# Altium footprint library Integrated Circuits.PcbLib: 142 footprints (part 4 of 9)
Each footprint in its own frame and in the unit in brackets; x right, y up, seen from the top. Pads: shape width x height; smd on the part's side, far side on the other; paste and mask are expansions set on the pad; w line width, h text height; cw(c..) or ccw(c..) is an arc to the next point about the centre after c.
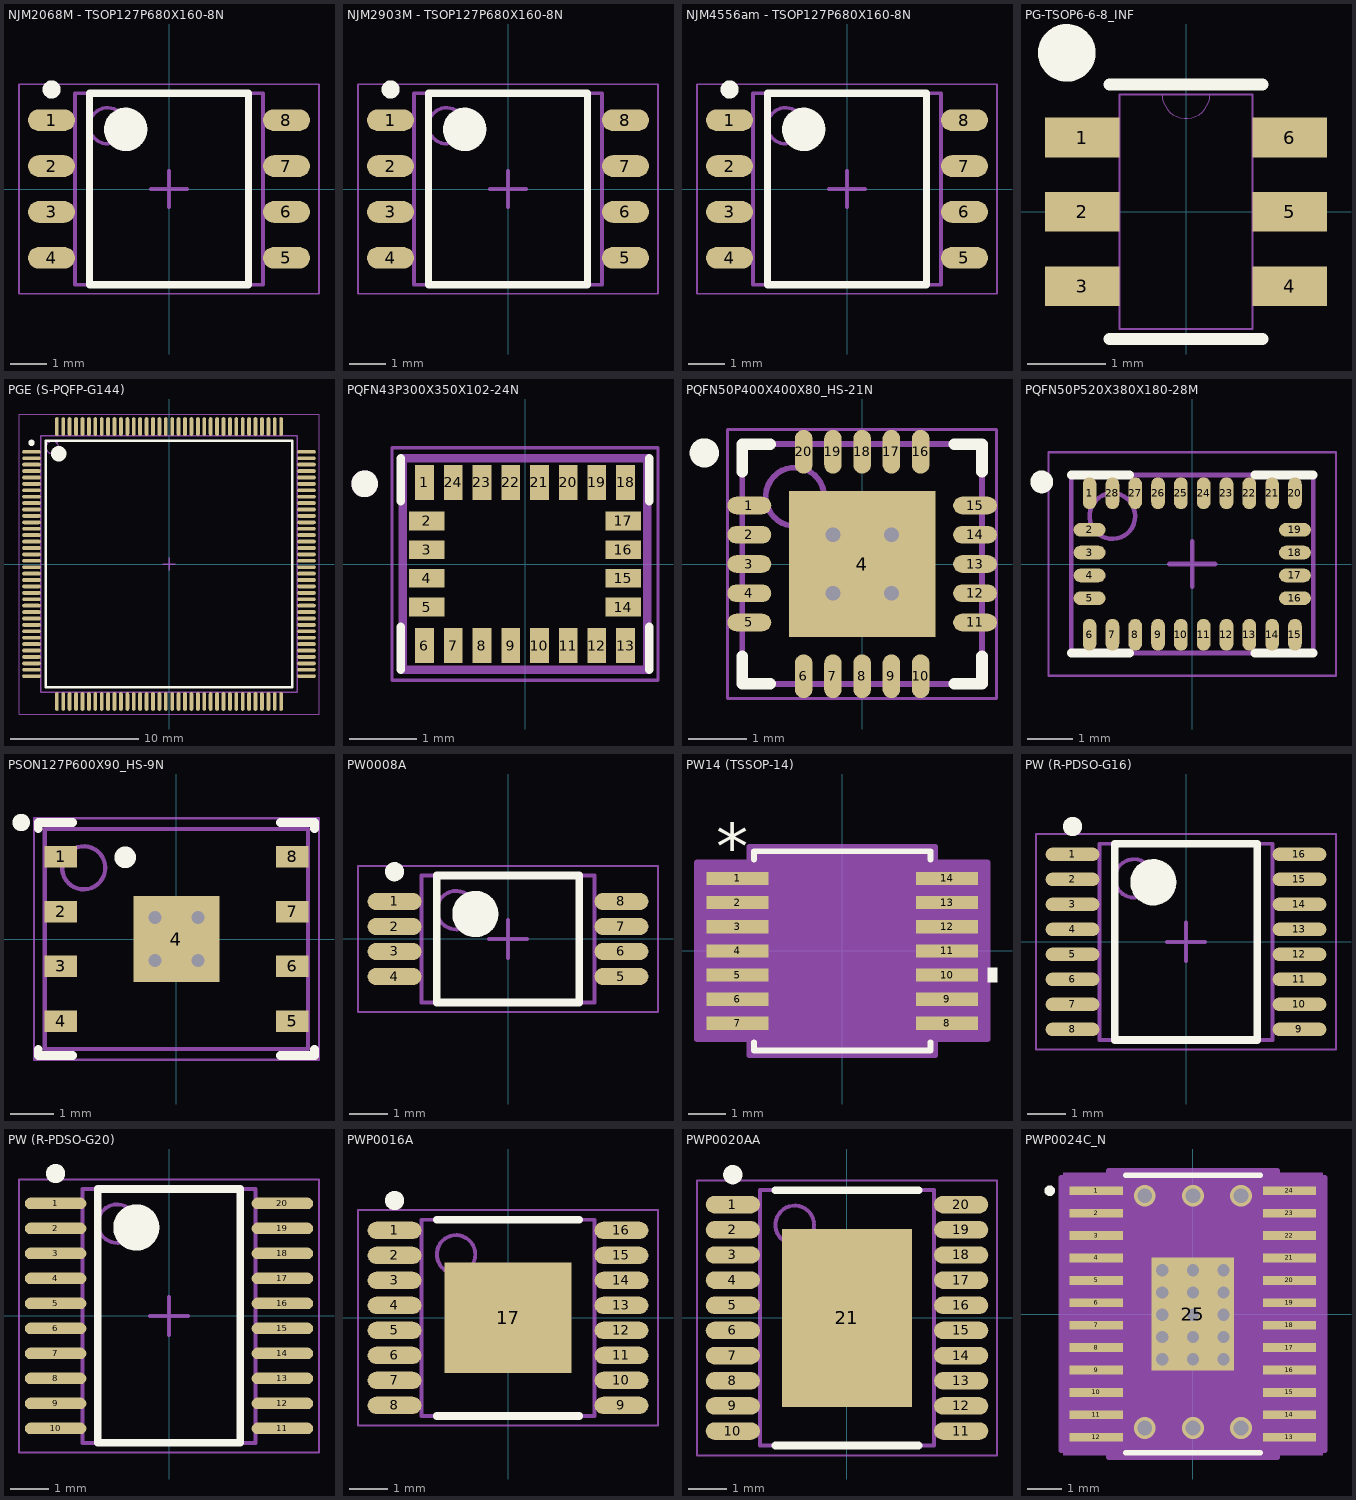
[diagram p3: the footprints below, top view; thin cyan lines are the x and y axes]

## NJM2068M - TSOP127P680X160-8N [mm] "TSOP, 8-Leads, Body 5.00x5.00mm, Pitch 1.27mm, IPC Medium Density"
height 1.6
pads (8):
  oval 1.3x0.6 smd: 1(-3.25,1.905) 2(-3.25,0.635) 3(-3.25,-0.635) 4(-3.25,-1.905) 5(3.25,-1.905) 6(3.25,-0.635) 7(3.25,0.635) 8(3.25,1.905)
Top Overlay:
  circle w0.6: c-1.2,1.65 r0.3
  circle w0.25: c-3.25,2.755 r0.125
  lines w0.2: -2.2,-2.65 2.2,-2.65 2.2,2.65 -2.2,2.65 -2.2,-2.65
Top Courtyard:
  lines w0.05: -4.15,-2.9 4.15,-2.9 4.15,2.9 -4.15,2.9 -4.15,-2.9
  lines w0.1: -0.5,0 0.5,0 ; 0,-0.5 0,0.5
Top Assembly:
  circle w0.1: c-1.7,1.75 r0.5
  lines w0.1: -2.6,-2.65 2.6,-2.65 2.6,2.65 -2.6,2.65 -2.6,-2.65
3D body "DMP8 - NJM2068M v4.step": height 1.75, standoff 0, extent -3.399,-2.502 3.399,2.502

## NJM2903M - TSOP127P680X160-8N [mm] "TSOP, 8-Leads, Body 5.00x5.00mm, Pitch 1.27mm, IPC Medium Density"
height 1.6
pads (8):
  oval 1.3x0.6 smd: 1(-3.25,1.905) 2(-3.25,0.635) 3(-3.25,-0.635) 4(-3.25,-1.905) 5(3.25,-1.905) 6(3.25,-0.635) 7(3.25,0.635) 8(3.25,1.905)
Top Overlay:
  circle w0.25: c-3.25,2.755 r0.125
  circle w0.6: c-1.2,1.65 r0.3
  lines w0.2: -2.2,-2.65 -2.2,2.65 2.2,2.65 2.2,-2.65 -2.2,-2.65
Top Courtyard:
  lines w0.05: -4.15,-2.9 -4.15,2.9 4.15,2.9 4.15,-2.9 -4.15,-2.9
  lines w0.1: -0.5,0 0.5,0 ; 0,-0.5 0,0.5
Top Assembly:
  circle w0.1: c-1.7,1.75 r0.5
  lines w0.1: -2.6,-2.65 -2.6,2.65 2.6,2.65 2.6,-2.65 -2.6,-2.65
3D body "DMP8 - NJM2903M v2.step": height 1.75, standoff 0, extent -3.399,-2.502 3.399,2.502

## NJM4556am - TSOP127P680X160-8N [mm] "TSOP, 8-Leads, Body 5.00x5.00mm, Pitch 1.27mm, IPC Medium Density"
height 1.6
pads (8):
  oval 1.3x0.6 smd: 1(-3.25,1.905) 2(-3.25,0.635) 3(-3.25,-0.635) 4(-3.25,-1.905) 5(3.25,-1.905) 6(3.25,-0.635) 7(3.25,0.635) 8(3.25,1.905)
Top Overlay:
  circle w0.25: c-3.25,2.755 r0.125
  circle w0.6: c-1.2,1.65 r0.3
  lines w0.2: -2.2,-2.65 -2.2,2.65 2.2,2.65 2.2,-2.65 -2.2,-2.65
Top Courtyard:
  lines w0.05: -4.15,-2.9 -4.15,2.9 4.15,2.9 4.15,-2.9 -4.15,-2.9
  lines w0.1: -0.5,0 0.5,0 ; 0,-0.5 0,0.5
Top Assembly:
  circle w0.1: c-1.7,1.75 r0.5
  lines w0.1: -2.6,-2.65 -2.6,2.65 2.6,2.65 2.6,-2.65 -2.6,-2.65
3D body "DMP8 - NJM4556AM v1.step": height 1.75, standoff 0, extent -3.399,-2.502 3.399,2.502

## PG-TSOP6-6-8_INF [mil]
pads (6):
  rect 37.5x20 smd paste+0 mask+0: 1(-52.25,37.4) 2(-52.25,0) 3(-52.25,-37.4) 4(52.25,-37.4) 5(52.25,0) 6(52.25,37.4)
Top Overlay:
  circle w15: c-60,80 r7
  lines w6: -38.5,-64 38.5,-64 ; -38.5,64 38.5,64
3D Bodies:
  lines w0: -12,59 ccw(c0,59) 12,59
  lines w1: -57,-46.4 -57,-28.4 -33.5,-28.4 -33.5,-46.4 -57,-46.4 ; -57,-9 -57,9 -33.5,9 -33.5,-9 -57,-9 ; -57,28.4 -57,46.4 -33.5,46.4 -33.5,28.4 -57,28.4 ; -33.5,-59 33.5,-59 33.5,59 -33.5,59 -33.5,-59 ; 33.5,-46.4 33.5,-28.4 57,-28.4 57,-46.4 33.5,-46.4 ; 33.5,-9 33.5,9 57,9 57,-9 33.5,-9 ; 33.5,28.4 33.5,46.4 57,46.4 57,28.4 33.5,28.4
3D body "PG-TSOP6-6-8_INF.step": height 43.11, standoff 0, extent -57.01,-59.02 57.01,59.02

## PGE (S-PQFP-G144) [mm] "TSQFP, 144-Leads, Body 20.00x20.00mm, Pitch 0.50mm, IPC Medium Density"
height 1.6
pads (144):
  oval 1.45x0.3 smd: 1(-10.725,8.75) 2(-10.725,8.25) 3(-10.725,7.75) 4(-10.725,7.25) 5(-10.725,6.75) 6(-10.725,6.25) 7(-10.725,5.75) 8(-10.725,5.25) 9(-10.725,4.75) 10(-10.725,4.25) 11(-10.725,3.75) 12(-10.725,3.25) 13(-10.725,2.75) 14(-10.725,2.25) 15(-10.725,1.75) 16(-10.725,1.25) 17(-10.725,0.75) 18(-10.725,0.25) 19(-10.725,-0.25) 20(-10.725,-0.75) 21(-10.725,-1.25) 22(-10.725,-1.75) 23(-10.725,-2.25) 24(-10.725,-2.75) 25(-10.725,-3.25) 26(-10.725,-3.75) 27(-10.725,-4.25) 28(-10.725,-4.75) 29(-10.725,-5.25) 30(-10.725,-5.75) 31(-10.725,-6.25) 32(-10.725,-6.75) 33(-10.725,-7.25) 34(-10.725,-7.75) 35(-10.725,-8.25) 36(-10.725,-8.75) 73(10.725,-8.75) 74(10.725,-8.25) 75(10.725,-7.75) 76(10.725,-7.25) 77(10.725,-6.75) 78(10.725,-6.25) 79(10.725,-5.75) 80(10.725,-5.25) 81(10.725,-4.75) 82(10.725,-4.25) 83(10.725,-3.75) 84(10.725,-3.25) 85(10.725,-2.75) 86(10.725,-2.25) 87(10.725,-1.75) 88(10.725,-1.25) 89(10.725,-0.75) 90(10.725,-0.25) 91(10.725,0.25) 92(10.725,0.75) 93(10.725,1.25) 94(10.725,1.75) 95(10.725,2.25) 96(10.725,2.75) 97(10.725,3.25) 98(10.725,3.75) 99(10.725,4.25) 100(10.725,4.75) 101(10.725,5.25) 102(10.725,5.75) 103(10.725,6.25) 104(10.725,6.75) 105(10.725,7.25) 106(10.725,7.75) 107(10.725,8.25) 108(10.725,8.75)
  oval 0.3x1.45 smd: 37(-8.75,-10.725) 38(-8.25,-10.725) 39(-7.75,-10.725) 40(-7.25,-10.725) 41(-6.75,-10.725) 42(-6.25,-10.725) 43(-5.75,-10.725) 44(-5.25,-10.725) 45(-4.75,-10.725) 46(-4.25,-10.725) 47(-3.75,-10.725) 48(-3.25,-10.725) 49(-2.75,-10.725) 50(-2.25,-10.725) 51(-1.75,-10.725) 52(-1.25,-10.725) 53(-0.75,-10.725) 54(-0.25,-10.725) 55(0.25,-10.725) 56(0.75,-10.725) 57(1.25,-10.725) 58(1.75,-10.725) 59(2.25,-10.725) 60(2.75,-10.725) 61(3.25,-10.725) 62(3.75,-10.725) 63(4.25,-10.725) 64(4.75,-10.725) 65(5.25,-10.725) 66(5.75,-10.725) 67(6.25,-10.725) 68(6.75,-10.725) 69(7.25,-10.725) 70(7.75,-10.725) 71(8.25,-10.725) 72(8.75,-10.725) 109(8.75,10.725) 110(8.25,10.725) 111(7.75,10.725) 112(7.25,10.725) 113(6.75,10.725) 114(6.25,10.725) 115(5.75,10.725) 116(5.25,10.725) 117(4.75,10.725) 118(4.25,10.725) 119(3.75,10.725) 120(3.25,10.725) 121(2.75,10.725) 122(2.25,10.725) 123(1.75,10.725) 124(1.25,10.725) 125(0.75,10.725) 126(0.25,10.725) 127(-0.25,10.725) 128(-0.75,10.725) 129(-1.25,10.725) 130(-1.75,10.725) 131(-2.25,10.725) 132(-2.75,10.725) 133(-3.25,10.725) 134(-3.75,10.725) 135(-4.25,10.725) 136(-4.75,10.725) 137(-5.25,10.725) 138(-5.75,10.725) 139(-6.25,10.725) 140(-6.75,10.725) 141(-7.25,10.725) 142(-7.75,10.725) 143(-8.25,10.725) 144(-8.75,10.725)
Top Overlay:
  circle w0.6: c-8.6,8.6 r0.3
  circle w0.25: c-10.725,9.45 r0.125
  lines w0.2: -9.6,-9.6 9.6,-9.6 9.6,9.6 -9.6,9.6 -9.6,-9.6
3D Bodies:
  circle w0.1: c-9.1,9.1 r0.5
  lines w0.1: -10,-10 10,-10 10,10 -10,10 -10,-10
Mechanical 15:
  lines w0.05: -11.7,-11.7 11.7,-11.7 11.7,11.7 -11.7,11.7 -11.7,-11.7
  lines w0.1: -0.5,0 0.5,0 ; 0,-0.5 0,0.5
3D body "PGE (S-PQFP-G144).step": height 1.6, standoff 0, extent -11,-11 11,11

## PQFN43P300X350X102-24N [mm] "LSM9DS1TR  IMU ACCEL/GYRO/MAG I2C/SPI 24LGA"
height 1
pads (24):
  rect 0.28x0.53 smd: 1(-1.505,1.22) 6(-1.505,-1.22) 7(-1.075,-1.22) 8(-0.645,-1.22) 9(-0.215,-1.22) 10(0.215,-1.22) 11(0.645,-1.22) 12(1.075,-1.22) 13(1.505,-1.22) 18(1.505,1.22) 19(1.075,1.22) 20(0.645,1.22) 21(0.215,1.22) 22(-0.215,1.22) 23(-0.645,1.22) 24(-1.075,1.22)
  rect 0.53x0.28 smd: 2(-1.47,0.645) 3(-1.47,0.215) 4(-1.47,-0.215) 5(-1.47,-0.645) 14(1.47,-0.645) 15(1.47,-0.215) 16(1.47,0.215) 17(1.47,0.645)
Top Overlay:
  circle w0.2: c-2.4,1.2 r0.1
  lines w0.127: -1.86,-1.58 -1.86,-0.94 ; -1.86,0.94 -1.86,1.58 ; 1.86,-1.58 1.86,-0.94 ; 1.86,0.94 1.86,1.58
3D Bodies:
  circle w0.2: c-2.4,1.2 r0.1
  circle w0.2: c-2.4,1.2 r0.1
  lines w0.127: -1.83,-1.58 -1.83,1.58 ; -1.83,-1.58 1.83,-1.58 ; -1.83,-1.58 -1.83,1.58 ; -1.83,-1.58 1.83,-1.58 ; -1.83,1.58 1.83,1.58 ; -1.83,1.58 1.83,1.58 ; 1.83,-1.58 1.83,1.58 ; 1.83,-1.58 1.83,1.58
Mechanical 15:
  lines w0.05: -1.99,-1.74 -1.99,1.74 1.99,1.74 1.99,-1.74 -1.99,-1.74
3D body "User Library-LGA-24L_3_5x3_0_43p.step": height 1, standoff 0, extent -1.735,-1.497 1.765,1.503

## PQFN50P400X400X80_HS-21N [mm] "PQFN, 20-Leads, Body 4.00x4.00mm, Pitch 0.50mm, Thermal Pad 2.50x2.50mm, IPC Medium Density"
height 0.8
pads (21):
  oval 0.75x0.3 smd: 1(-1.93,1) 2(-1.93,0.5) 3(-1.93,0) 4(-1.93,-0.5) 5(-1.93,-1) 11(1.93,-1) 12(1.93,-0.5) 13(1.93,0) 14(1.93,0.5) 15(1.93,1)
  rect 2.5x2.5 smd mask+0: 4(0,0)
  oval 0.3x0.75 smd: 6(-1,-1.92) 7(-0.5,-1.92) 8(0,-1.92) 9(0.5,-1.92) 10(1,-1.92) 16(1,1.92) 17(0.5,1.92) 18(0,1.92) 19(-0.5,1.92) 20(-1,1.92)
via -0.5,-0.5 diameter 0.55 hole 0.25
via 0.5,-0.5 diameter 0.55 hole 0.25
via -0.5,0.5 diameter 0.55 hole 0.25
via 0.5,0.5 diameter 0.55 hole 0.25
Top Overlay:
  circle w0.25: c-2.7,1.9 r0.125
  lines w0.2: -2.05,-1.575 -2.05,-2.05 -1.575,-2.05 ; -2.05,1.575 -2.05,2.05 -1.575,2.05 ; 1.575,-2.05 2.05,-2.05 2.05,-1.575 ; 1.575,2.05 2.05,2.05 2.05,1.575
3D Bodies:
  circle w0.1: c-1.15,1.15 r0.5
  lines w0.1: -2.05,-2.05 -2.05,2.05 2.05,2.05 2.05,-2.05 -2.05,-2.05
Mechanical 15:
  lines w0.05: -2.3,-2.3 -2.3,2.3 2.3,2.3 2.3,-2.3 -2.3,-2.3
  lines w0.1: -0.5,0 0.5,0 ; 0,-0.5 0,0.5
3D body: height 0.8, standoff 0.02, extent -2.05,-2.05 2.05,2.05

## PQFN50P520X380X180-28M [mm] "PQFN, 28-Leads, Body 5.20x3.80mm, Pitch 0.50mm, IPC Low Density"
height 1.8
pads (28):
  oval 0.3x0.7 smd: 1(-2.25,1.55) 6(-2.25,-1.55) 7(-1.75,-1.55) 8(-1.25,-1.55) 9(-0.75,-1.55) 10(-0.25,-1.55) 11(0.25,-1.55) 12(0.75,-1.55) 13(1.25,-1.55) 14(1.75,-1.55) 15(2.25,-1.55) 20(2.25,1.55) 21(1.75,1.55) 22(1.25,1.55) 23(0.75,1.55) 24(0.25,1.55) 25(-0.25,1.55) 26(-0.75,1.55) 27(-1.25,1.55) 28(-1.75,1.55)
  oval 0.7x0.3 smd: 2(-2.25,0.75) 3(-2.25,0.25) 4(-2.25,-0.25) 5(-2.25,-0.75) 16(2.25,-0.75) 17(2.25,-0.25) 18(2.25,0.25) 19(2.25,0.75)
Top Overlay:
  circle w0.25: c-3.3,1.8 r0.125
  lines w0.2: -2.65,-1.95 -1.375,-1.95 ; -2.65,1.95 -1.375,1.95 ; 1.375,-1.95 2.65,-1.95 ; 1.375,1.95 2.65,1.95
3D Bodies:
  circle w0.1: c-1.75,1.05 r0.5
  lines w0.1: -2.65,-1.95 -2.65,1.95 2.65,1.95 2.65,-1.95 -2.65,-1.95
Mechanical 15:
  lines w0.05: -3.15,-2.45 -3.15,2.45 3.15,2.45 3.15,-2.45 -3.15,-2.45
  lines w0.1: -0.5,0 0.5,0 ; 0,-0.5 0,0.5
3D body "PQFN50P520X380X180-28M.step": height 1.8, standoff 0, extent -2.65,-1.95 2.65,1.95

## PSON127P600X90_HS-9N [mm] "PSON, 8-Leads, Body 5.00x6.00mm, Pitch 1.27mm, Thermal Pad 2.00x2.00mm, IPC Medium Density"
height 0.9
pads (9):
  rect 0.75x0.5 smd: 1(-2.685,1.905) 2(-2.685,0.635) 3(-2.685,-0.635) 4(-2.685,-1.905) 5(2.685,-1.905) 6(2.685,-0.635) 7(2.685,0.635) 8(2.685,1.905)
  rect 2x2 smd: 4(0,0)
via -0.5,0.5 diameter 0.6 hole 0.3
via 0.5,0.5 diameter 0.6 hole 0.3
via -0.5,-0.5 diameter 0.6 hole 0.3
via 0.5,-0.5 diameter 0.6 hole 0.3
Top Overlay:
  circle w0.4: c-1.188,1.893 r0.05
  circle w0.3: c-3.6,2.7 r0.05
  lines w0.2: -3.2,-2.555 -3.2,-2.7 -2.41,-2.7 ; -3.2,2.555 -3.2,2.7 -2.41,2.7 ; 2.41,-2.7 3.2,-2.7 3.2,-2.555 ; 2.41,2.7 3.2,2.7 3.2,2.555
3D Bodies:
  circle w0.1: c-2.15,1.65 r0.5
  lines w0.1: -3.05,-2.55 -3.05,2.55 3.05,2.55 3.05,-2.55 -3.05,-2.55
Mechanical 15:
  lines w0.05: -3.305,-2.8 -3.305,2.8 3.305,2.8 3.305,-2.8 -3.305,-2.8
  lines w0.1: -0.5,0 0.5,0 ; 0,-0.5 0,0.5
3D body "PSON127P600X90_HS-9N.step": height 0.9, standoff 0, extent -3.051,-2.55 3.051,2.55

## PW0008A [mm] "TSOP, 8-Leads, Body 3.07x4.40mm, Pitch 0.65mm, IPC Medium Density"
height 1.2
pads (8):
  oval 1.4x0.45 smd: 1(-2.95,0.975) 2(-2.95,0.325) 3(-2.95,-0.325) 4(-2.95,-0.975) 5(2.95,-0.975) 6(2.95,-0.325) 7(2.95,0.325) 8(2.95,0.975)
Top Overlay:
  circle w0.6: c-0.85,0.65 r0.3
  circle w0.25: c-2.95,1.75 r0.125
  lines w0.2: -1.85,-1.65 1.85,-1.65 1.85,1.65 -1.85,1.65 -1.85,-1.65
3D Bodies:
  circle w0.1: c-1.35,0.75 r0.5
  lines w0.1: -2.25,-1.65 2.25,-1.65 2.25,1.65 -2.25,1.65 -2.25,-1.65
Mechanical 15:
  lines w0.05: -3.9,-1.9 3.9,-1.9 3.9,1.9 -3.9,1.9 -3.9,-1.9
  lines w0.1: -0.5,0 0.5,0 ; 0,-0.5 0,0.5
3D body "PW0008A.step": height 1.2, standoff 0, extent -3.2,-1.65 3.2,1.65

## PW14 (TSSOP-14) [mil] "TSSOP-14 TI designator: PW"
pads (14):
  rect 66x14 smd paste+0 mask+0: 1(-111,76.77) 2(-111,51.18) 3(-111,25.59) 4(-111,0) 5(-111,-25.59) 6(-111,-51.18) 7(-111,-76.77) 8(111,-76.77) 9(111,-51.18) 10(111,-25.59) 11(111,0) 12(111,25.59) 13(111,51.18) 14(111,76.77)
Top Overlay:
  region: 154,-18.09 164,-18.09 164,-33.09 154,-33.09
  lines w6: -93.5,-96.87 -93.5,-105.5 93.5,-105.5 93.5,-96.87 ; -93.5,96.87 -93.5,105.5 93.5,105.5 93.5,96.87
  text "*" at -133.5,85.77 h50
3D Bodies:
  lines w0: -12,100.5 ccw(c0,100.5) 12,100.5
  lines w1: -130,-82.77 -88.5,-82.77 -88.5,-70.77 -130,-70.77 -130,-82.77 ; -130,-57.18 -88.5,-57.18 -88.5,-45.18 -130,-45.18 -130,-57.18 ; -130,-31.59 -88.5,-31.59 -88.5,-19.59 -130,-19.59 -130,-31.59 ; -130,-6 -88.5,-6 -88.5,6 -130,6 -130,-6 ; -130,19.59 -88.5,19.59 -88.5,31.59 -130,31.59 -130,19.59 ; -130,45.18 -88.5,45.18 -88.5,57.18 -130,57.18 -130,45.18 ; -130,70.77 -88.5,70.77 -88.5,82.77 -130,82.77 -130,70.77 ; -88.5,-100.5 -88.5,100.5 88.5,100.5 88.5,-100.5 -88.5,-100.5 ; 88.5,-82.77 130,-82.77 130,-70.77 88.5,-70.77 88.5,-82.77 ; 88.5,-57.18 130,-57.18 130,-45.18 88.5,-45.18 88.5,-57.18 ; 88.5,-31.59 130,-31.59 130,-19.59 88.5,-19.59 88.5,-31.59 ; 88.5,-6 130,-6 130,6 88.5,6 88.5,-6 ; 88.5,19.59 130,19.59 130,31.59 88.5,31.59 88.5,19.59 ; 88.5,45.18 130,45.18 130,57.18 88.5,57.18 88.5,45.18 ; 88.5,70.77 130,70.77 130,82.77 88.5,82.77 88.5,70.77
  text "*" at -86,47.5 h50
Mechanical 15:
  region: -98.5,-93.77 -154,-93.77 -154,93.77 -98.5,93.77 -98.5,110.5 98.5,110.5 98.5,93.77 154,93.77 154,-93.77 98.5,-93.77 98.5,-110.5 -98.5,-110.5
  lines w6: -154,-93.77 -98.5,-93.77 -98.5,-110.5 98.5,-110.5 98.5,-93.77 154,-93.77 154,93.77 98.5,93.77 98.5,110.5 -98.5,110.5 -98.5,93.77 -154,93.77 -154,-93.77
3D body: height 10, standoff 0, extent 0,0 10,10

## PW (R-PDSO-G16) [mm]
height 1.2
pads (16):
  oval 1.4x0.35 smd: 1(-2.95,2.275) 2(-2.95,1.625) 3(-2.95,0.975) 4(-2.95,0.325) 5(-2.95,-0.325) 6(-2.95,-0.975) 7(-2.95,-1.625) 8(-2.95,-2.275) 9(2.95,-2.275) 10(2.95,-1.625) 11(2.95,-0.975) 12(2.95,-0.325) 13(2.95,0.325) 14(2.95,0.975) 15(2.95,1.625) 16(2.95,2.275)
Top Overlay:
  circle w0.25: c-2.95,3 r0.125
  circle w0.6: c-0.85,1.55 r0.3
  lines w0.2: -1.85,-2.55 -1.85,2.55 1.85,2.55 1.85,-2.55 -1.85,-2.55
3D Bodies:
  circle w0.1: c-1.35,1.65 r0.5
  lines w0.1: -2.25,-2.55 -2.25,2.55 2.25,2.55 2.25,-2.55 -2.25,-2.55
Mechanical 15:
  lines w0.05: -3.9,-2.8 -3.9,2.8 3.9,2.8 3.9,-2.8 -3.9,-2.8
  lines w0.1: -0.5,0 0.5,0 ; 0,-0.5 0,0.5
3D body "SOP127P600-8N.step": height 1.2, standoff 0, extent -3.2,-2.55 3.2,2.55

## PW (R-PDSO-G20) [mm]
height 1.2
pads (20):
  oval 1.6x0.3 smd: 1(-2.95,2.925) 2(-2.95,2.275) 3(-2.95,1.625) 4(-2.95,0.975) 5(-2.95,0.325) 6(-2.95,-0.325) 7(-2.95,-0.975) 8(-2.95,-1.625) 9(-2.95,-2.275) 10(-2.95,-2.925) 11(2.95,-2.925) 12(2.95,-2.275) 13(2.95,-1.625) 14(2.95,-0.975) 15(2.95,-0.325) 16(2.95,0.325) 17(2.95,0.975) 18(2.95,1.625) 19(2.95,2.275) 20(2.95,2.925)
Top Overlay:
  circle w0.25: c-2.95,3.7 r0.125
  circle w0.6: c-0.85,2.3 r0.3
  lines w0.2: -1.85,-3.3 -1.85,3.3 1.85,3.3 1.85,-3.3 -1.85,-3.3
3D Bodies:
  circle w0.1: c-1.35,2.4 r0.5
  lines w0.1: -2.25,-3.3 -2.25,3.3 2.25,3.3 2.25,-3.3 -2.25,-3.3
Mechanical 15:
  lines w0.05: -3.9,-3.55 -3.9,3.55 3.9,3.55 3.9,-3.55 -3.9,-3.55
  lines w0.1: -0.5,0 0.5,0 ; 0,-0.5 0,0.5
3D body "SOP127P600-8N.step": height 1.2, standoff 0, extent -3.2,-3.3 3.2,3.3

## PWP0016A [mm] "TSOP, 16-Leads, Body 5.00x4.40mm, Pitch 0.65mm, Thermal Pad 2.87x3.30mm, IPC Medium Density"
height 1.2
pads (17):
  oval 1.4x0.45 smd: 1(-2.95,2.275) 2(-2.95,1.625) 3(-2.95,0.975) 4(-2.95,0.325) 5(-2.95,-0.325) 6(-2.95,-0.975) 7(-2.95,-1.625) 8(-2.95,-2.275) 9(2.95,-2.275) 10(2.95,-1.625) 11(2.95,-0.975) 12(2.95,-0.325) 13(2.95,0.325) 14(2.95,0.975) 15(2.95,1.625) 16(2.95,2.275)
  rect 3.3x2.87 smd: 17(0,0)
Top Overlay:
  circle w0.25: c-2.95,3.05 r0.125
  lines w0.2: -1.85,-2.55 1.85,-2.55 ; -1.85,2.55 1.85,2.55
3D Bodies:
  circle w0.1: c-1.35,1.65 r0.5
  lines w0.1: -2.25,-2.55 2.25,-2.55 2.25,2.55 -2.25,2.55 -2.25,-2.55
Mechanical 15:
  lines w0.05: -3.9,-2.8 3.9,-2.8 3.9,2.8 -3.9,2.8 -3.9,-2.8
  lines w0.1: -0.5,0 0.5,0 ; 0,-0.5 0,0.5
3D body "PWP0016A.step": height 1.2, standoff 0, extent -3.2,-2.55 3.2,2.55

## PWP0020AA [mm] "TSOP, 20-Leads, Body 6.50x4.40mm, Pitch 0.65mm, Thermal Pad 4.60x3.35mm, IPC Medium Density"
height 1.1
pads (21):
  oval 1.4x0.45 smd: 1(-2.95,2.925) 2(-2.95,2.275) 3(-2.95,1.625) 4(-2.95,0.975) 5(-2.95,0.325) 6(-2.95,-0.325) 7(-2.95,-0.975) 8(-2.95,-1.625) 9(-2.95,-2.275) 10(-2.95,-2.925) 11(2.95,-2.925) 12(2.95,-2.275) 13(2.95,-1.625) 14(2.95,-0.975) 15(2.95,-0.325) 16(2.95,0.325) 17(2.95,0.975) 18(2.95,1.625) 19(2.95,2.275) 20(2.95,2.925)
  rect 3.35x4.6 smd: 21(0,0)
Top Overlay:
  circle w0.25: c-2.95,3.7 r0.125
  lines w0.2: -1.85,-3.3 1.85,-3.3 ; -1.85,3.3 1.85,3.3
3D Bodies:
  circle w0.1: c-1.35,2.4 r0.5
  lines w0.1: -2.25,-3.3 2.25,-3.3 2.25,3.3 -2.25,3.3 -2.25,-3.3
Mechanical 15:
  lines w0.05: -3.875,-3.55 3.875,-3.55 3.875,3.55 -3.875,3.55 -3.875,-3.55
  lines w0.1: -0.5,0 0.5,0 ; 0,-0.5 0,0.5
3D body "PWP0020AA.step": height 1.1, standoff 0, extent -3.2,-3.3 3.2,3.3

## PWP0024C_N [mil] "24HTSSOP w/ power pad"
pads (25):
  rect 61x10 smd paste+0 mask+2: 1(-110.24,140.75) 2(-110.24,115.16) 3(-110.24,89.57) 4(-110.24,63.98) 5(-110.24,38.39) 6(-110.24,12.8) 7(-110.24,-12.8) 8(-110.24,-38.39) 9(-110.24,-63.98) 10(-110.24,-89.57) 11(-110.24,-115.16) 12(-110.24,-140.75) 13(110.24,-140.75) 14(110.24,-115.16) 15(110.24,-89.57) 16(110.24,-63.98) 17(110.24,-38.39) 18(110.24,-12.8) 19(110.24,12.8) 20(110.24,38.39) 21(110.24,63.98) 22(110.24,89.57) 23(110.24,115.16) 24(110.24,140.75)
  rect 94x129 smd paste-64 mask+3: 25(0,0)
via 0,-26.18 diameter 19 hole 14
via -55,135 diameter 25 hole 17
via 0,135 diameter 25 hole 17
via 55,135 diameter 25 hole 17
via 55,-130 diameter 25 hole 17
via 0,-130 diameter 25 hole 17
via -55,-130 diameter 25 hole 17
via 0,50 diameter 19 hole 14
via 35,50 diameter 19 hole 14
via -35,50 diameter 19 hole 14
via 35,-51.57 diameter 19 hole 14
via 0,-51.57 diameter 19 hole 14
via -35,-51.57 diameter 19 hole 14
via 35,-26.18 diameter 19 hole 14
via -35,-26.18 diameter 19 hole 14
via 35,-0.79 diameter 19 hole 14
via 0,-0.79 diameter 19 hole 14
via -35,-0.79 diameter 19 hole 14
via 35,24.61 diameter 19 hole 14
via 0,24.61 diameter 19 hole 14
via -35,24.61 diameter 19 hole 14
Top Overlay:
  circle w6: c-163.53,140.75 r3
  lines w6: -76.74,-158.5 76.74,-158.5 ; -76.74,158.5 76.74,158.5
Top Paste:
  region: 43.06,60.56 -43.06,60.56 -43.06,3.94 43.06,3.94
  region: 43.06,-3.94 -43.06,-3.94 -43.06,-60.56 43.06,-60.56
Top Dimensions and Assy Info:
  region: 148.24,-161 -148.24,-161 -148.24,161 148.24,161
3D Bodies:
  circle w0: c-76.5,140.75 r3
  lines w0: -12,153.5 ccw(c0,153.5) 12,153.5
  lines w1: -86.5,-153.5 86.5,-153.5 86.5,153.5 -86.5,153.5 -86.5,-153.5
Mechanical 15:
  region: -96.5,-155.54 -150.74,-155.54 -150.74,155.54 -96.5,155.54 -96.5,163.5 96.5,163.5 96.5,155.54 150.74,155.54 150.74,-155.54 96.5,-155.54 96.5,-163.5 -96.5,-163.5
  lines w6: -150.74,-155.54 -150.74,155.54 -96.5,155.54 -96.5,163.5 96.5,163.5 96.5,155.54 150.74,155.54 150.74,-155.54 96.5,-155.54 96.5,-163.5 -96.5,-163.5 -96.5,-155.54 -150.74,-155.54
Mechanical 16:
  circle w0.5: c-0.01,-127.96 r6.25
  circle w0.5: c-0.01,-76.78 r6.25
  circle w0.5: c-0.01,-25.6 r6.25
  circle w0.5: c-0.01,25.58 r6.25
  circle w0.5: c-0.01,76.76 r6.25
  circle w0.5: c-0.01,127.94 r6.25
  circle w0.5: c51.18,-127.96 r6.25
  circle w0.5: c51.18,-76.78 r6.25
  circle w0.5: c51.18,-25.6 r6.25
  circle w0.5: c51.18,25.58 r6.25
  circle w0.5: c51.18,76.76 r6.25
  circle w0.5: c51.18,127.94 r6.25
  circle w0.5: c-51.19,-127.96 r6.25
  circle w0.5: c-51.19,-76.78 r6.25
  circle w0.5: c-51.19,-25.6 r6.25
  circle w0.5: c-51.19,25.58 r6.25
  circle w0.5: c-51.19,76.76 r6.25
  circle w0.5: c-51.19,127.94 r6.25
3D body: height 10, standoff 0, extent 0,0 10,10
3D body "PWP0024B.stp": height 39.37, standoff 0, extent -126.39,-154.32 126.4,152.76